# Altium footprint library Connectors.PcbLib: 135 footprints (part 1 of 9)
Each footprint in its own frame and in the unit in brackets; x right, y up, seen from the top. Pads: shape width x height; smd on the part's side, far side on the other; paste and mask are expansions set on the pad; w line width, h text height; cw(c..) or ccw(c..) is an arc to the next point about the centre after c.
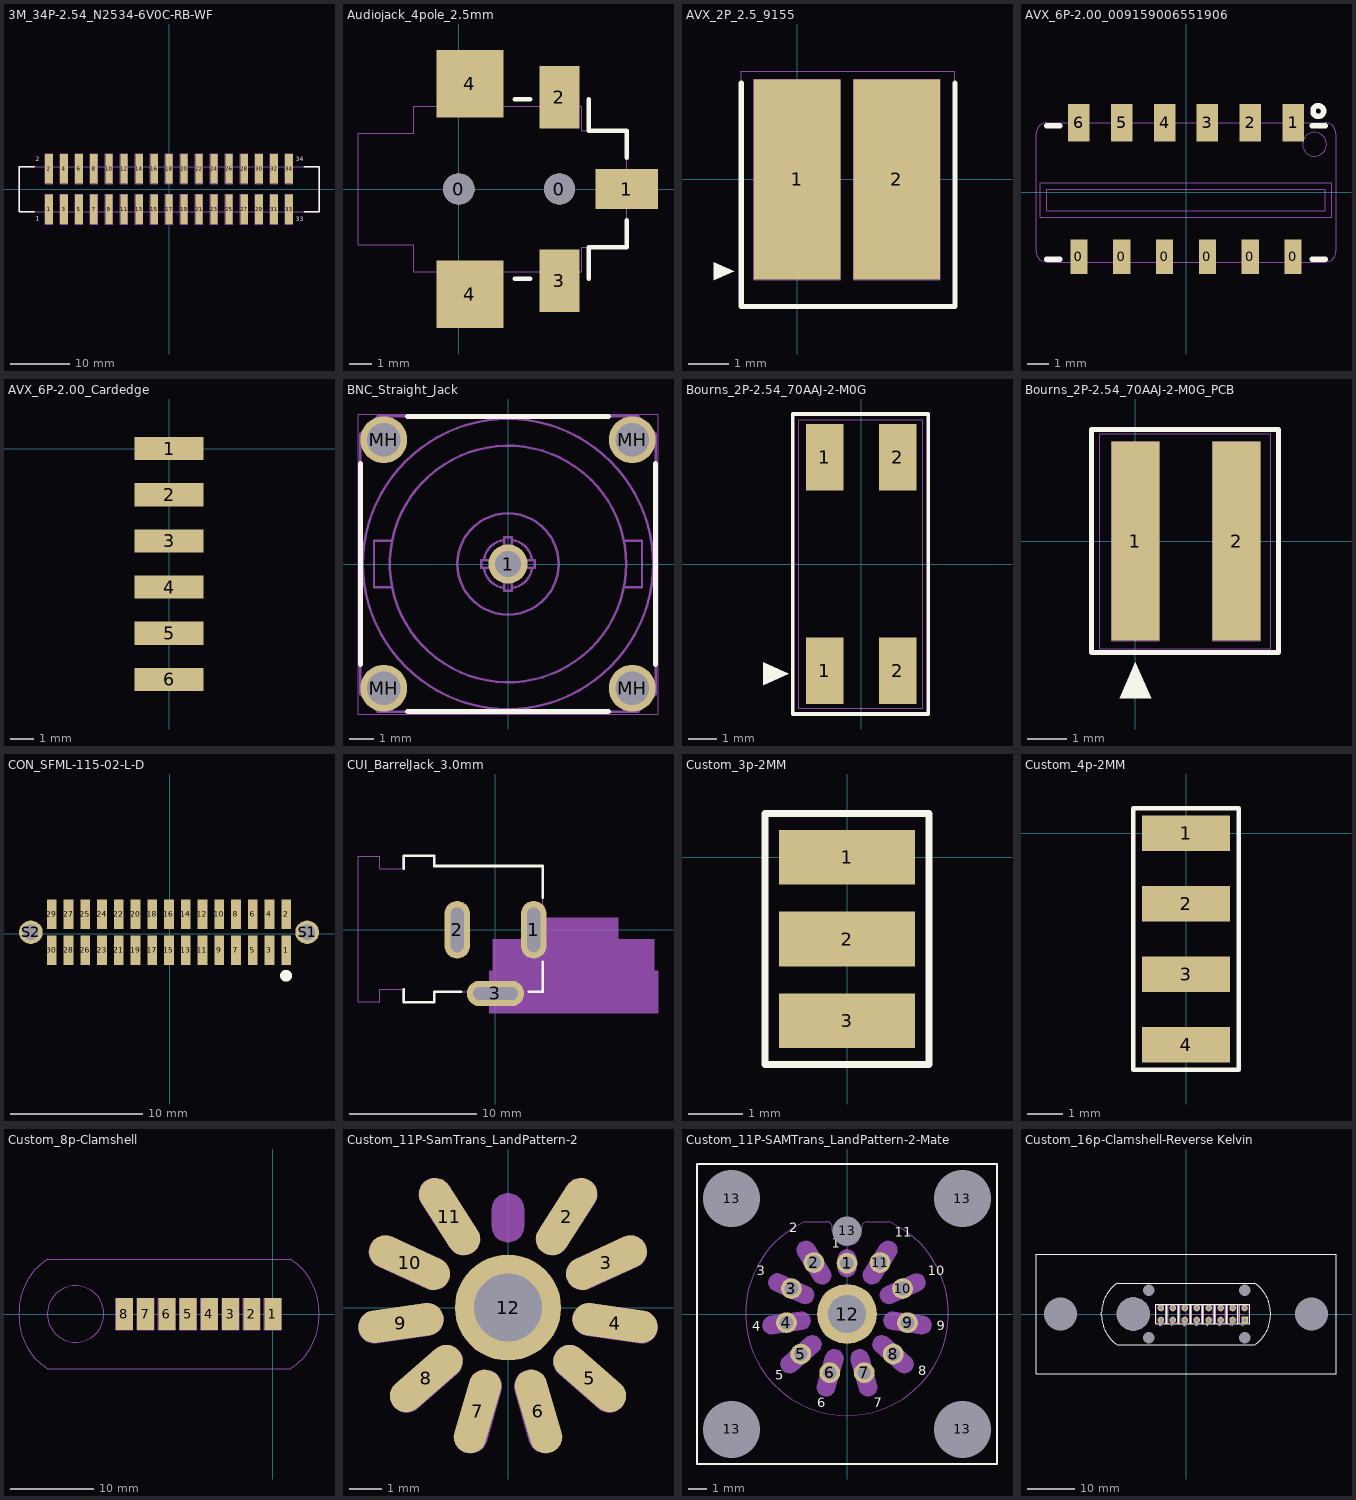
[diagram p0: the footprints below, top view; thin cyan lines are the x and y axes]

## 3M_34P-2.54_N2534-6V0C-RB-WF [mil] "Connector Header IDC 34PIN SMT"
height 393.7
pads (34):
  rect 50x200 smd: 1(-800,-135) 2(-800,135) 3(-700,-135) 4(-700,135) 5(-600,-135) 6(-600,135) 7(-500,-135) 8(-500,135) 9(-400,-135) 10(-400,135) 11(-300,-135) 12(-300,135) 13(-200,-135) 14(-200,135) 15(-100,-135) 16(-100,135) 17(0,-135) 18(0,135) 19(100,-135) 20(100,135) 21(200,-135) 22(200,135) 23(300,-135) 24(300,135) 25(400,-135) 26(400,135) 27(500,-135) 28(500,135) 29(600,-135) 30(600,135) 31(700,-135) 32(700,135) 33(800,-135) 34(800,135)
Top Overlay:
  lines w10: -900,-150 -1000,-150 -1000,150 -900,150 ; 900,-150 1000,-150 1000,150 900,150
  text "2" at -890,175 h50
  text "1" at -890,-220 h50
  text "34" at 845,175 h50
  text "33" at 845,-225 h50
Mechanical 1:
  lines w1: -1000,-150 -1000,150 1000,150 1000,-150 -1000,-150 ; -825,-235 -775,-235 -775,-35 -825,-35 -825,-235 ; -825,35 -825,235 -775,235 -775,35 -825,35 ; -725,-235 -675,-235 -675,-35 -725,-35 -725,-235 ; -725,35 -725,235 -675,235 -675,35 -725,35 ; -625,-235 -575,-235 -575,-35 -625,-35 -625,-235 ; -625,35 -625,235 -575,235 -575,35 -625,35 ; -525,-235 -475,-235 -475,-35 -525,-35 -525,-235 ; -525,35 -525,235 -475,235 -475,35 -525,35 ; -425,-235 -375,-235 -375,-35 -425,-35 -425,-235 ; -425,35 -425,235 -375,235 -375,35 -425,35 ; -325,-235 -275,-235 -275,-35 -325,-35 -325,-235 ; -325,35 -325,235 -275,235 -275,35 -325,35 ; -225,-235 -175,-235 -175,-35 -225,-35 -225,-235 ; -225,35 -225,235 -175,235 -175,35 -225,35 ; -125,-235 -75,-235 -75,-35 -125,-35 -125,-235 ; -125,35 -125,235 -75,235 -75,35 -125,35 ; -25,-235 25,-235 25,-35 -25,-35 -25,-235 ; -25,35 -25,235 25,235 25,35 -25,35 ; 75,-235 125,-235 125,-35 75,-35 75,-235 ; 75,35 75,235 125,235 125,35 75,35 ; 175,-235 225,-235 225,-35 175,-35 175,-235 ; 175,35 175,235 225,235 225,35 175,35 ; 275,-235 325,-235 325,-35 275,-35 275,-235 ; 275,35 275,235 325,235 325,35 275,35 ; 375,-235 425,-235 425,-35 375,-35 375,-235 ; 375,35 375,235 425,235 425,35 375,35 ; 475,-235 525,-235 525,-35 475,-35 475,-235 ; 475,35 475,235 525,235 525,35 475,35 ; 575,-235 625,-235 625,-35 575,-35 575,-235 ; 575,35 575,235 625,235 625,35 575,35 ; 675,-235 725,-235 725,-35 675,-35 675,-235 ; 675,35 675,235 725,235 725,35 675,35 ; 775,-235 825,-235 825,-35 775,-35 775,-235 ; 775,35 775,235 825,235 825,35 775,35
  text "33" at 835,-210 h39.37
  text "34" at 835,175 h39.37
  text "2" at -870,175 h39.37
  text "1" at -870,-210 h39.37
  text ".Designator" at -105,-15 h50

## Audiojack_4pole_2.5mm [mm] "Audiojack 4 poles 2.5mm plug"
pads (7):
  round 1.4 hole 1.4 unplated paste-1.4: 0(0,0) 0(4.5,0)
  rect 2.8x1.8 smd: 1(7.5,0)
  rect 1.8x2.8 smd: 2(4.5,4.1) 3(4.5,-4.1)
  rect 3x3 smd: 4(0.5,-4.7) 4(0.5,4.7)
Top Overlay:
  lines w0.2: 2.5,-4 3.2,-4 ; 2.5,4 3.2,4 ; 5.8,-4 5.8,-2.6 7.5,-2.6 7.5,-1.4 ; 5.8,4 5.8,2.6 7.5,2.6 7.5,1.4
Mechanical 1:
  circle w0.025: c0,0 r0.451
  circle w0.025: c4.5,0 r0.451
  lines w0.025: -4.5,-2.5 -2,-2.5 -2,-3.7 5.5,-3.7 5.5,-2.6 7.5,-2.6 7.5,2.6 5.5,2.6 5.5,3.7 -2,3.7 -2,2.5 -4.5,2.5 -4.5,-2.5
  text ".Designator" at -3.25,6.75 h1.52
3D body "CUI_sj1-42534-smt.stp": height 5.07, standoff -0.53, extent -4.5,-5.2 8,5.2

## AVX_2P_2.5_9155 [mil] "Connector Battery 2pos 2.5mmp"
pads (2):
  rect 85x197 smd: 1(0,0) 2(98,0)
Top Overlay:
  region: -81.96,-81.57 -81.96,-99.28 -62.04,-90.43
  lines w5: -55,95 -55,-125 155,-125 155,95
Mechanical 1:
  lines w1: -55,-125 155,-125 155,106.3 -55,106.3 -55,-125 ; -42.5,-98.5 42.5,-98.5 42.5,98.5 -42.5,98.5 -42.5,-98.5 ; 55.5,-98.5 55.5,98.5 140.5,98.5 140.5,-98.5 55.5,-98.5
  text "2" at 90.13,-17.75 h39.37
  text "1" at -7.87,-15.75 h39.37
  text ".Designator" at -62,120 h60

## AVX_6P-2.00_009159006551906 [mm] "Connector Card Edge 6pos 2mmp"
pads (12):
  rect 0.8x1.6 smd: 0(-5,-3) 0(-3,-3) 0(-1,-3) 0(1,-3) 0(3,-3) 0(5,-3)
  rect 1x1.75 smd: 1(5,3.25) 2(3,3.25) 3(1,3.25) 4(-1,3.25) 5(-3,3.25) 6(-5,3.25)
Top Overlay:
  circle w0.254: c6.175,3.8 r0.25
  lines w0.254: -6.502,-3.124 -5.9,-3.124 ; -6.5,3.123 -5.901,3.123 ; 5.9,-3.124 6.502,-3.124 ; 5.901,3.123 6.5,3.123
Mechanical 1:
  lines w0.025: -7,-2.75 ccw(c-6.5,-2.75) -6.5,-3.25 6.5,-3.25 ccw(c6.5,-2.75) 7,-2.75 7,2.75 ccw(c6.5,2.75) 6.5,3.25 -6.5,3.25 ccw(c-6.5,2.75) -7,2.75 -7,-2.75 ; -6.8,-1.15 6.8,-1.15 6.8,0.45 -6.8,0.45 -6.8,-1.15 ; -6.5,-0.85 6.5,-0.85 6.5,0.15 -6.5,0.15 -6.5,-0.85
  text ".Designator" at -1.5,5 h1.52
Mechanical 13:
  circle w0.025: c6,2.25 r0.559
  lines w0.025: -5.3,-3.75 -5.3,-3.25 -4.7,-3.25 -4.7,-3.75 -5.3,-3.75 ; -5.3,3.25 -5.3,3.75 -4.7,3.75 -4.7,3.25 -5.3,3.25 ; -3.3,-3.75 -3.3,-3.25 -2.7,-3.25 -2.7,-3.75 -3.3,-3.75 ; -3.3,3.25 -2.7,3.25 -2.7,3.75 -3.3,3.75 -3.3,3.25 ; -1.3,-3.75 -1.3,-3.25 -0.7,-3.25 -0.7,-3.75 -1.3,-3.75 ; -1.3,3.25 -0.7,3.25 -0.7,3.75 -1.3,3.75 -1.3,3.25 ; 0.7,-3.75 0.7,-3.25 1.3,-3.25 1.3,-3.75 0.7,-3.75 ; 0.7,3.25 1.3,3.25 1.3,3.75 0.7,3.75 0.7,3.25 ; 2.7,-3.75 2.7,-3.25 3.3,-3.25 3.3,-3.75 2.7,-3.75 ; 2.7,3.25 3.3,3.25 3.3,3.75 2.7,3.75 2.7,3.25 ; 4.7,-3.75 5.3,-3.75 5.3,-3.25 4.7,-3.25 4.7,-3.75 ; 4.7,3.25 5.3,3.25 5.3,3.75 4.7,3.75 4.7,3.25
3D body "avx 6-pin top entry.STEP": height 5.1, standoff 0, extent -7,-3.75 7,3.75

## AVX_6P-2.00_Cardedge [mm] "Connector Card Edge 6pos 2mmp"
pads (6):
  rect 3x1 smd paste+0: 1(0,0) 2(0,-2) 3(0,-4) 4(0,-6) 5(0,-8) 6(0,-10)
Mechanical 1:
  text ".Designator" at 2,-6.5 h1.52

## BNC_Straight_Jack [mm] "BNC 50R Straight Jack, 12x12x15mm"
height 15
pads (5):
  round 1.6 hole 1.05: 1(0,0)
  round 1.9 hole 1.35: MH(-5.05,-5.05) MH(-5.05,5.05) MH(5.05,-5.05) MH(5.05,5.05)
Top Overlay:
  lines w0.2: -6,-4.09 -6,4.09 ; -4.09,-6 4.09,-6 ; -4.09,6 4.09,6 ; 6,-4.09 6,4.09
Mechanical 1:
  circle w0.1: c0,0 r2.06
  circle w0.1: c0,0 r4.81
  circle w0.1: c5.05,5.05 r0.6
  circle w0.1: c5.05,-5.05 r0.6
  circle w0.1: c-5.05,-5.05 r0.6
  circle w0.1: c-5.05,5.05 r0.6
  circle w0.1: c0,0 r0.45
  circle w0.1: c5.05,5.05 r0.3
  circle w0.1: c-5.05,5.05 r0.3
  circle w0.1: c-5.05,-5.05 r0.3
  circle w0.1: c5.05,-5.05 r0.3
  circle w0.1: c0,0 r5.9
  lines w0.1: -4.699,-0.95 -5.45,-0.95 -5.45,0.952 -4.699,0.952 ; -0.989,-0.148 ccw(c0,0) -0.148,-0.989 ; -0.989,0.148 cw(c0,0) -0.148,0.989 ; -0.685,-0.147 ccw(c0,0) -0.15,-0.684 ; -0.684,0.15 cw(c0,0) -0.147,0.685 ; -0.684,-0.15 -1.09,-0.15 -1.09,0.15 -0.684,0.15 ; -0.15,-0.684 -0.15,-1.09 0.15,-1.09 0.15,-0.684 ; -0.15,0.684 -0.15,1.09 0.15,1.09 0.15,0.684 ; 0.147,-0.685 ccw(c0,0) 0.684,-0.15 ; 0.148,-0.989 ccw(c0,0) 0.989,-0.148 ; 0.148,0.989 cw(c0,0) 0.989,0.148 ; 0.15,0.684 cw(c0,0) 0.685,0.147 ; 0.684,-0.15 1.09,-0.15 1.09,0.15 0.684,0.15 ; 4.699,-0.95 5.45,-0.95 5.45,0.952 4.699,0.952 ; -6,-5.294 -6,5.294 -5.294,6 5.294,6 6,5.294 6,-5.294 5.294,-6 -5.294,-6 -6,-5.294
  text ".Designator" at -2.54,6.35 h1.52
Mechanical 15:
  lines w0.05: -6.1,-6.1 -6.1,6.1 6.1,6.1 6.1,-6.1 -6.1,-6.1
  lines w0.1: -0.5,0 0.5,0 ; 0,-0.5 0,0.5
3D body "51k101-400a4.stp": height 15, standoff -3.97, extent -6,-6 6,6

## Bourns_2P-2.54_70AAJ-2-M0G [mm] "Connector Battery 2pos 2.54mmp"
height 2.54
pads (4):
  rect 1.3x2.3 smd: 1(-1.27,-3.7) 1(-1.27,3.7) 2(1.27,-3.7) 2(1.27,3.7)
Top Overlay:
  region: -3.404,-3.41 -3.404,-4.21 -2.504,-3.81
  lines w0.127: -2.37,-5.2 2.33,-5.2 2.33,5.2 -2.37,5.2 -2.37,-5.2
Mechanical 1:
  lines w0.025: -2.17,-5 2.13,-5 2.13,5 -2.17,5 -2.17,-5 ; -1.87,-4.8 -0.67,-4.8 -0.67,-2.6 -1.87,-2.6 -1.87,-4.8 ; -1.87,2.6 -1.87,4.8 -0.67,4.8 -0.67,2.6 -1.87,2.6 ; 0.67,-4.8 1.87,-4.8 1.87,-2.6 0.67,-2.6 0.67,-4.8 ; 0.67,2.6 0.67,4.8 1.87,4.8 1.87,2.6 0.67,2.6
  text "1" at -1.47,3.3 h1
  text ".Designator" at -1.191,-0.4 h1.52
3D body: height 0.1, standoff 0, extent -1.645,3.075 -0.895,4.225
3D body: height 2.54, standoff 0.1, extent -2.5,-4.225 2.5,4.225
3D body: height 0.1, standoff 0, extent 0.895,3.075 1.645,4.225
3D body: height 0.1, standoff 0, extent 0.895,-4.225 1.645,-3.075
3D body: height 0.1, standoff 0, extent -1.645,-4.225 -0.895,-3.075
3D body: height 3.91, standoff 2.64, extent -1.72,-2.4 -0.82,3.6
3D body: height 3.91, standoff 2.64, extent 0.82,-2.4 1.72,3.6

## Bourns_2P-2.54_70AAJ-2-M0G_PCB [mm] "Connector Battery 2pos 2.54mmp PCB"
pads (2):
  rect 1.2x5 smd paste+0: 1(0,0)
  rect 1.2x5 smd: 2(2.54,0)
Top Overlay:
  region: -0.4,-3.95 0.4,-3.95 0,-3.05
  lines w0.127: -1.1,-2.8 3.6,-2.8 3.6,2.8 -1.1,2.8 -1.1,-2.8
Mechanical 1:
  lines w0.025: -0.9,-2.7 3.4,-2.7 3.4,2.7 -0.9,2.7 -0.9,-2.7 ; -0.6,-2.5 -0.6,2.5 0.6,2.5 0.6,-2.5 -0.6,-2.5 ; 1.94,-2.5 1.94,2.5 3.14,2.5 3.14,-2.5 1.94,-2.5
  text "1" at -0.2,-0.4 h1
  text ".Designator" at -2.2,3.4 h1.52

## CON_SFML-115-02-L-D [mm] "Samtec 30 Position Receptacle Connector 0.050\" (1.27mm) Surface Mount Gold"
pads (32):
  rect 0.74x2.22 smd: 1(8.839,-1.246) 2(8.839,1.484) 3(7.569,-1.246) 4(7.569,1.484) 5(6.299,-1.246) 6(6.299,1.484) 7(5.029,-1.246) 8(5.029,1.484) 9(3.759,-1.246) 10(3.759,1.484) 11(2.489,-1.246) 12(2.489,1.484) 13(1.219,-1.246) 14(1.219,1.484) 15(-0.051,-1.246) 16(-0.051,1.484) 17(-1.321,-1.246) 18(-1.321,1.484) 19(-2.591,-1.246) 20(-2.591,1.484) 21(-3.861,-1.246) 22(-3.861,1.484) 23(-5.131,-1.246) 24(-5.131,1.484) 25(-6.401,1.484) 26(-6.401,-1.246) 27(-7.671,1.484) 28(-7.671,-1.246) 29(-8.941,1.484) 30(-8.941,-1.246)
  round 1.8 hole 1.194: S1(10.429,0.119) S2(-10.531,0.119)
Top Overlay:
  circle w0.5: c8.824,-3.181 r0.202
3D body "SFML-115-02-L-D.stp": height 4.71, standoff 0.01, extent -11.544,-2.04 11.443,2.214

## CUI_BarrelJack_3.0mm [mm] "Barrel Jack, 3.0mm x 9.1mm through hole"
height 1.854
pads (3):
  rrect100% 2x4.5 hole 1 slot 3.5 at 90 deg: 1(3,0) 2(-3,0)
  rrect100% 4.5x2 hole 1 slot 3.5 at 0 deg: 3(0,-5)
Top Overlay:
  lines w0.2: -7.2,-4.65 -7.2,-5.7 -4.8,-5.7 -4.8,-4.873 -2.7,-4.873 ; -7.2,4.8 -7.2,5.777 ; -7.2,5.8 -4.8,5.8 -4.8,5 3.7,5 3.7,2.5 ; 2.6,-4.873 3.7,-4.873 3.7,-2.5
Mechanical 1:
  lines w0.025: -4.8,-5.65 -4.8,-4.873 ; -4.8,5.777 -4.8,5 ; -4.785,-5.65 -7.285,-5.65 ; -4.785,-4.873 -4.8,-4.873 ; -4.785,5 -4.8,5 ; -4.785,5.777 -7.285,5.777 ; -7.285,-5.65 -7.285,-5.65 ; -7.285,-5.65 -7.285,-4.65 -9.085,-4.65 -9.085,-5.65 -10.785,-5.65 -10.785,5.777 -9.085,5.777 -9.085,4.777 -7.285,4.777 -7.285,5.777 ; -7.285,5.777 -7.285,5.777 ; -4.8,-4.873 3.7,-4.873 3.7,5 -4.8,5
  text ".Designator" at -4.532,6.87 h1.52
Mechanical 11:
  pour cut-out: -0.2,-0.75 2.606,-0.75 2.606,0.953 9.644,0.953 9.644,-0.75 12.45,-0.75 12.45,-3.198 12.748,-3.198 12.748,-6.552 -0.498,-6.552 -0.498,-3.198 -0.2,-3.198
3D body "CUI_pj-048h.stp": height 12.6, standoff -3.5, extent -10.784,-5.623 3.716,5.777

## Custom_3p-2MM [mm] "Custom 3p SMT Pad For Wire"
height 0.025
pads (3):
  rect 2.5x1 smd paste+0: 1(0,0) 2(0,-1.5) 3(0,-3)
Top Overlay:
  lines w0.127: -1.5,-3.8 -1.5,0.8 1.5,0.8 1.5,-3.8 -1.5,-3.8

## Custom_4p-2MM [mm] "Custom 4p SMT Pad For Wire"
height 0.025
pads (4):
  rect 2.5x1 smd paste+0: 1(0,0) 2(0,-2) 3(0,-4) 4(0,-6)
Top Overlay:
  lines w0.127: -1.5,-6.706 -1.5,0.7 1.5,0.7 1.5,-6.706 -1.5,-6.706

## Custom_8p-Clamshell [mil] "Custom 8p for Clamshell"
pads (8):
  rect 80x150 smd: 1(0,0) 2(-100,0) 3(-200,0) 4(-300,0) 5(-400,0) 6(-500,0) 7(-600,0) 8(-700,0)
Mechanical 1:
  circle w1: c-930,0 r133
  lines w1: -340,-75 -260,-75 ; -340,-75 -340,75 ; -340,-75 -260,-75 ; -340,-75 -340,75 ; -340,75 -260,75 ; -340,75 -260,75 ; -260,-75 -260,75 ; -260,-75 -260,75 ; -1197,-10 ccw(c-899.97,-10) -1064.2,-257.5 84.2,-257.5 ccw(c-80.03,-10) 217,-10 217,10 ccw(c-80.03,10) 84.2,257.5 -1064.2,257.5 ccw(c-899.97,10) -1197,10 -1197,-10 ; -740,-75 -660,-75 -660,75 -740,75 -740,-75 ; -640,-75 -560,-75 -560,75 -640,75 -640,-75 ; -540,-75 -460,-75 -460,75 -540,75 -540,-75 ; -440,-75 -360,-75 -360,75 -440,75 -440,-75 ; -240,-75 -160,-75 -160,75 -240,75 -240,-75 ; -140,-75 -60,-75 -60,75 -140,75 -140,-75 ; -40,-75 40,-75 40,75 -40,75 -40,-75
3D body: height 2, standoff 0, extent -740,-75 -660,75
3D body: height 2, standoff 0, extent -640,-75 -560,75
3D body: height 2, standoff 0, extent -540,-75 -460,75
3D body: height 2, standoff 0, extent -440,-75 -360,75
3D body: height 2, standoff 0, extent -340,-75 -260,75
3D body: height 2, standoff 0, extent -240,-75 -160,75
3D body: height 2, standoff 0, extent -140,-75 -60,75
3D body: height 2, standoff 0, extent -40,-75 40,75

## Custom_11P-SamTrans_LandPattern-2 [mil] "SAMTransConnector_LandPattern"
pads (11):
  rrect100% 40x105 smd rot 147.27: 2(71.64,111.46)
  rrect100% 40x105 smd rot 114.54: 3(120.53,55.04)
  rrect100% 40x105 smd rot 81.82: 4(131.15,-18.86)
  rrect100% 40x105 smd rot 49.09: 5(100.13,-86.77)
  rrect100% 40x105 smd rot 16.36: 6(37.33,-127.13)
  rrect100% 40x105 smd rot 163.64: 7(-37.33,-127.13)
  rrect100% 40x105 smd rot 130.91: 8(-100.14,-86.77)
  rrect100% 40x105 smd rot 98.18: 9(-131.15,-18.85)
  rrect100% 40x105 smd rot 65.45: 10(-120.53,55.04)
  rrect100% 40x105 smd rot 32.73: 11(-71.63,111.47)
  round 130 hole 83: 12(0,0)
Mechanical 18:
  drawing of 11 lines, arcs and shapes, not listed

## Custom_11P-SAMTrans_LandPattern-2-Mate [mil] "SAMTransConnector_Mate"
pads (17):
  round 45 hole 30: 1(0.15,110.04) 2(-71.64,111.46) 3(-120.53,55.04) 4(-131.15,-18.86) 5(-100.13,-86.77) 6(-37.33,-127.13) 7(37.33,-127.13) 8(100.14,-86.77) 9(131.15,-18.85) 10(120.53,55.04) 11(71.63,111.47)
  round 130 hole 83: 12(0,0)
  round 45 hole 124.02 unplated: 13(-250,-250) 13(-250,250) 13(250,-250) 13(250,250)
  round 45 hole 63 unplated: 13(0,180)
Top Overlay:
  lines w5: -325,-325 -325,325 325,325 325,-325 -325,-325
  text "6" at -64.27,-210 h35
  text "9" at 194.45,-42.49 h35
  text "8" at 154.45,-140 h35
  text "7" at 57.53,-210 h35
  text "1" at -33.24,136.42 h35
  text "2" at -125.55,170 h35
  text "3" at -195.55,76.38 h35
  text "4" at -205.55,-44.06 h35
  text "5" at -155.55,-150 h35
  text "10" at 174.45,76.75 h35
  text "11" at 103.94,160 h35
Mechanical 3:
  lines w2: -91.65,200 ccw(c0,0) 91.65,200 45,200 ccw(c45,186.5) 31.5,186.5 31.5,180.29 cw(c0,180) -31.5,180 -31.5,186.5 ccw(c-45,186.5) -45,200 -91.65,200
Mechanical 18:
  drawing of 11 lines, arcs and shapes, not listed

## Custom_16p-Clamshell-Reverse Kelvin [mil] "Custom 16p for Clamshell"
pads (23):
  rect 55x55 hole 30: 1(490,-50)
  round 55 hole 30: 2(390,-50) 3(290,-50) 4(190,-50) 5(90,-50) 6(-10,-50) 7(-110,-50) 8(-210,-50) 9(490,50) 10(390,50) 11(290,50) 12(190,50) 13(90,50) 14(-10,50) 15(-110,50) 16(-210,50)
  round 55 hole 96 unplated: 17(490,200) 18(-310,200) 19(490,-200) 20(-310,-200)
  round 55 hole 280 unplated: 21(-440,0) 22(1050,0) 23(-1050,0)
Top Overlay:
  circle w5: c-440,0 r133
  lines w5: -165,-80 -165,80 ; -155,-80 -155,80 ; -65,-80 -65,80 ; -55,-80 -55,80 ; 35,-80 35,80 ; 45,-80 45,80 ; 135,-80 135,80 ; 145,-80 145,80 ; 235,-80 235,80 ; 245,-80 245,80 ; 335,-80 335,80 ; 345,-80 345,80 ; 435,-80 435,80 ; 445,-80 445,80 ; -1255,-500 -1255,500 1255,500 1255,-500 -1255,-500 ; -707,-10 ccw(c-409.97,-10) -574.2,-257.5 574.2,-257.5 ccw(c409.97,-10) 707,-10 707,10 ccw(c409.97,10) 574.2,257.5 -574.2,257.5 ccw(c-409.97,10) -707,10 -707,-10 ; -255,-80 -255,80 535,80 535,-80 -255,-80
  text "8" at -195,-105 h35
  text "7" at -95,-105 h35
  text "6" at 5,-105 h35
  text "5" at 105,-105 h35
  text "4" at 200,-105 h35
  text "3" at 305,-105 h35
  text "2" at 400,-105 h35
  text "1" at 490,-105 h35
Mechanical 1:
  lines w1: 150,-75 230,-75 ; 150,-75 150,75 ; 150,-75 230,-75 ; 150,-75 150,75 ; 150,75 230,75 ; 150,75 230,75 ; 230,-75 230,75 ; 230,-75 230,75 ; -250,-75 -170,-75 -170,75 -250,75 -250,-75 ; -150,-75 -70,-75 -70,75 -150,75 -150,-75 ; -50,-75 30,-75 30,75 -50,75 -50,-75 ; 50,-75 130,-75 130,75 50,75 50,-75 ; 250,-75 330,-75 330,75 250,75 250,-75 ; 350,-75 430,-75 430,75 350,75 350,-75 ; 450,-75 530,-75 530,75 450,75 450,-75
  lines w5: 0,0 490,0